# Altium footprint library Display device.PcbLib: 47 footprints (part 3 of 3)
Each footprint in its own frame and in the unit in brackets; x right, y up, seen from the top. Pads: shape width x height; smd on the part's side, far side on the other; paste and mask are expansions set on the pad; w line width, h text height; cw(c..) or ccw(c..) is an arc to the next point about the centre after c.
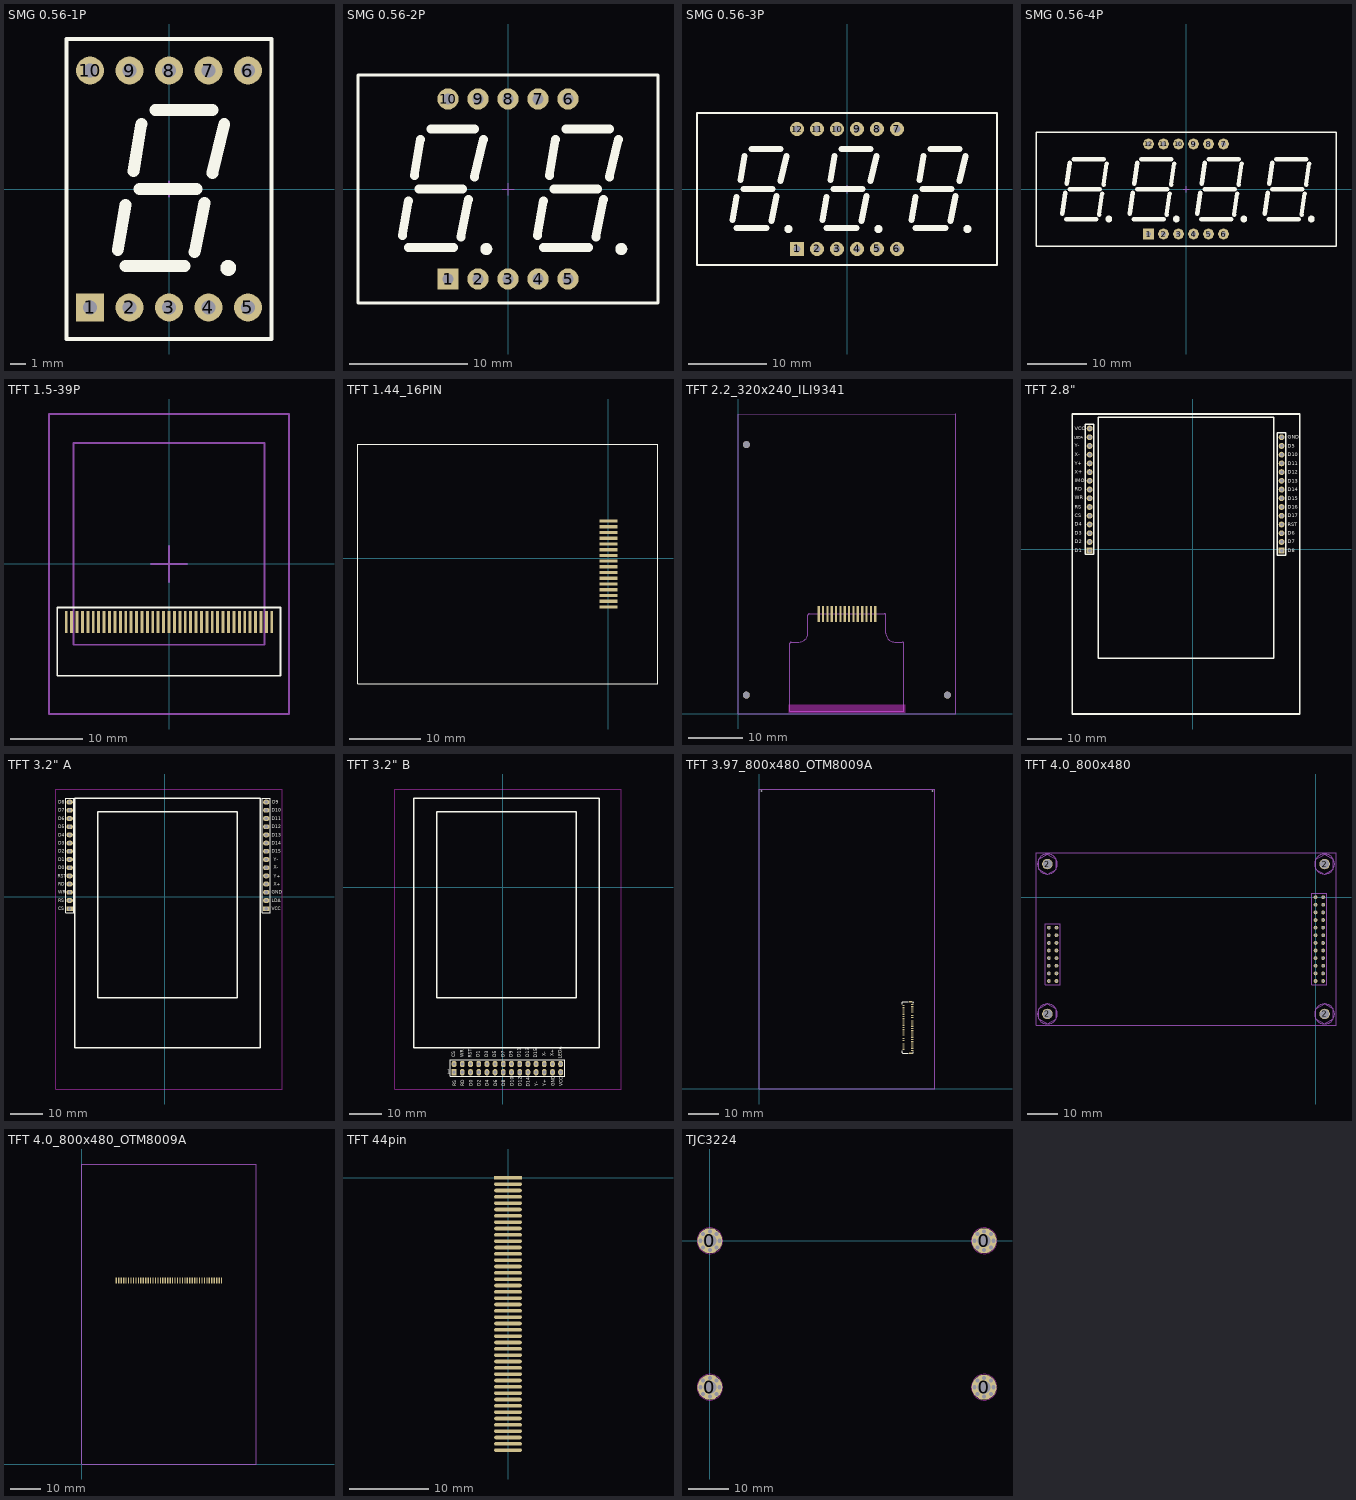
[diagram p2: the footprints below, top view; thin cyan lines are the x and y axes]

## SMG 0.56-1P [mm] "12.7*19*8mm(ï¿½ï¿½ï¿½ï¿½ï¿½)"
pads (10):
  rect 1.8x1.8 hole 0.9: 1(-5.08,-7.62)
  round 1.8 hole 0.9: 2(-2.54,-7.62) 3(0,-7.62) 4(2.54,-7.62) 5(5.08,-7.62) 6(5.08,7.62) 7(2.54,7.62) 8(0,7.62) 9(-2.54,7.62) 10(-5.08,7.62)
Top Overlay:
  circle w0.508: c3.81,-5.08 r0.254
  lines w0.254: -6.604,-9.652 -6.604,9.652 6.604,9.652 6.604,-9.652 -6.604,-9.652
  lines w0.762: -3.302,-3.937 -2.794,-1.016 ; -2.794,-4.953 1.016,-4.953 ; -2.286,1.143 -1.778,4.191 ; -1.905,0 1.778,0 ; -0.889,5.08 2.794,5.08 ; 1.651,-4.064 2.286,-0.889 ; 2.794,1.016 3.556,4.191
Mechanical 15:
  lines w0.1: -0.508,0 0.508,0 ; 0,-0.508 0,0.508
3D body "SMG 0.56-1P.STEP": height 8, standoff -3.6, extent -6.3,-9.5 6.3,9.5

## SMG 0.56-2P [mm] "25*19*8mm(ï¿½ï¿½ï¿½ï¿½ï¿½)"
pads (10):
  rect 1.8x1.8 hole 0.9: 1(-5.08,-7.62)
  round 1.8 hole 0.9: 2(-2.54,-7.62) 3(0,-7.62) 4(2.54,-7.62) 5(5.08,-7.62) 6(5.08,7.62) 7(2.54,7.62) 8(0,7.62) 9(-2.54,7.62) 10(-5.08,7.62)
Top Overlay:
  circle w0.508: c-1.841,-5.08 r0.254
  circle w0.508: c9.588,-5.08 r0.254
  lines w0.254: -12.7,-9.652 -12.7,9.652 12.7,9.652 12.7,-9.652 -12.7,-9.652
  lines w0.762: -8.954,-3.937 -8.445,-1.016 ; -8.445,-4.953 -4.635,-4.953 ; -7.938,1.143 -7.429,4.191 ; -7.556,0 -3.873,0 ; -6.54,5.08 -2.857,5.08 ; -4,-4.064 -3.365,-0.889 ; -2.857,1.016 -2.095,4.191 ; 2.476,-3.937 2.984,-1.016 ; 2.984,-4.953 6.794,-4.953 ; 3.492,1.143 4,4.191 ; 3.873,0 7.556,0 ; 4.889,5.08 8.572,5.08 ; 7.429,-4.064 8.064,-0.889 ; 8.572,1.016 9.335,4.191
Mechanical 15:
  lines w0.1: -0.508,0 0.508,0 ; 0,-0.508 0,0.508
3D body "SMG 0.56-2P.STEP": height 8, standoff -3.6, extent -12.5,-9.5 12.5,9.5

## SMG 0.56-3P [mm] "37.6*19*8mm(ï¿½ï¿½ï¿½ï¿½ï¿½)"
pads (12):
  rect 1.8x1.8 hole 0.9: 1(-6.35,-7.62)
  round 1.8 hole 0.9: 2(-3.81,-7.62) 3(-1.27,-7.62) 4(1.27,-7.62) 5(3.81,-7.62) 6(6.35,-7.62) 7(6.35,7.62) 8(3.81,7.62) 9(1.27,7.62) 10(-1.27,7.62) 11(-3.81,7.62) 12(-6.35,7.62)
Top Overlay:
  circle w0.508: c15.303,-5.08 r0.254
  circle w0.508: c-7.429,-5.08 r0.254
  circle w0.508: c4,-5.08 r0.254
  lines w0.254: -19.05,-9.652 -19.05,9.652 19.05,9.652 19.05,-9.652 -19.05,-9.652
  lines w0.762: -14.541,-3.937 -14.034,-1.016 ; -14.034,-4.953 -10.223,-4.953 ; -13.525,1.143 -13.018,4.191 ; -13.144,0 -9.461,0 ; -12.128,5.08 -8.445,5.08 ; -9.588,-4.064 -8.954,-0.889 ; -8.445,1.016 -7.683,4.191 ; -3.111,-3.937 -2.603,-1.016 ; -2.603,-4.953 1.206,-4.953 ; -2.095,1.143 -1.587,4.191 ; -1.714,0 1.968,0 ; -0.699,5.08 2.984,5.08 ; 1.841,-4.064 2.476,-0.889 ; 2.984,1.016 3.746,4.191 ; 8.191,-3.937 8.7,-1.016 ; 8.7,-4.953 12.509,-4.953 ; 9.207,1.143 9.716,4.191 ; 9.588,0 13.271,0 ; 10.604,5.08 14.287,5.08 ; 13.144,-4.064 13.779,-0.889 ; 14.287,1.016 15.05,4.191
Mechanical 15:
  lines w0.1: -0.508,0 0.508,0 ; 0,-0.508 0,0.508
3D body "SMG 0.56-3P.STEP": height 8, standoff -3.6, extent -18.8,-9.5 18.8,9.5

## SMG 0.56-4P [mm] "4Î»0.56ï¿½ï¿½ï¿½ï¿½ï¿½ï¿½Ü£ï¿½50.3*19mm"
pads (12):
  rect 1.8x1.8 hole 0.9: 1(-6.35,-7.62)
  round 1.8 hole 0.9: 2(-3.81,-7.62) 3(-1.27,-7.62) 4(1.27,-7.62) 5(3.81,-7.62) 6(6.35,-7.62) 7(6.35,7.62) 8(3.81,7.62) 9(1.27,7.62) 10(-1.27,7.62) 11(-3.81,7.62) 12(-6.35,7.62)
Top Overlay:
  circle w0.635: c-13.081,-5.08 r0.254
  circle w0.635: c-1.651,-5.08 r0.254
  circle w0.635: c9.779,-5.08 r0.254
  circle w0.635: c21.209,-5.08 r0.254
  lines w0.254: -25.4,-9.652 25.4,-9.652 25.4,9.652 -25.4,9.652 -25.4,-9.652
  lines w0.762: -20.955,-4.191 -20.447,-0.635 ; -20.32,-5.08 -15.24,-5.08 ; -20.193,0.889 -19.685,4.445 ; -19.685,0 -14.605,0 ; -19.05,5.08 -13.97,5.08 ; -14.732,-4.318 -14.224,-0.762 ; -13.97,0.762 -13.462,4.318 ; -9.525,-4.191 -9.017,-0.635 ; -8.89,-5.08 -3.81,-5.08 ; -8.763,0.889 -8.255,4.445 ; -8.255,0 -3.175,0 ; -7.62,5.08 -2.54,5.08 ; -3.302,-4.318 -2.794,-0.762 ; -2.54,0.762 -2.032,4.318 ; 1.905,-4.191 2.413,-0.635 ; 2.54,-5.08 7.62,-5.08 ; 2.667,0.889 3.175,4.445 ; 3.175,0 8.255,0 ; 3.81,5.08 8.89,5.08 ; 8.128,-4.318 8.636,-0.762 ; 8.89,0.762 9.398,4.318 ; 13.335,-4.191 13.843,-0.635 ; 13.97,-5.08 19.05,-5.08 ; 14.097,0.889 14.605,4.445 ; 14.605,0 19.685,0 ; 15.24,5.08 20.32,5.08 ; 19.558,-4.318 20.066,-0.762 ; 20.32,0.762 20.828,4.318
Mechanical 15:
  lines w0.1: -0.508,0 0.508,0 ; 0,-0.508 0,0.508
3D body "SMG 0.56-4P.STEP": height 8, standoff -3.6, extent -25.15,-9.5 25.15,9.5

## TFT 1.5-39P [mm]
pads (39):
  rect 0.4x3 smd: 1(-14.25,-8.05) 2(-13.5,-8.05) 3(-12.75,-8.05) 4(-12,-8.05) 5(-11.25,-8.05) 6(-10.5,-8.05) 7(-9.75,-8.05) 8(-9,-8.05) 9(-8.25,-8.05) 10(-7.5,-8.05) 11(-6.75,-8.05) 12(-6,-8.05) 13(-5.25,-8.05) 14(-4.5,-8.05) 15(-3.75,-8.05) 16(-3,-8.05) 17(-2.25,-8.05) 18(-1.5,-8.05) 19(-0.75,-8.05) 20(0,-8.05) 21(0.75,-8.05) 22(1.5,-8.05) 23(2.25,-8.05) 24(3,-8.05) 25(3.75,-8.05) 26(4.5,-8.05) 27(5.25,-8.05) 28(6,-8.05) 29(6.75,-8.05) 30(7.5,-8.05) 31(8.25,-8.05) 32(9,-8.05) 33(9.75,-8.05) 34(10.5,-8.05) 35(11.25,-8.05) 36(12,-8.05) 37(12.75,-8.05) 38(13.5,-8.05) 39(14.25,-8.05)
Top Overlay:
  lines w0.254: -15.495,-15.5 -15.495,-6.05 15.468,-6.05 15.468,-15.5 -15.495,-15.5
Mechanical 15:
  lines w0.254: -2.5,0 2.5,0 ; 0,-2.5 0,2.5 ; -16.65,-20.8 -16.65,20.8 16.65,20.8 16.65,-20.8 -16.65,-20.8 ; -13.25,-11.2 13.25,-11.2 13.25,16.8 -13.25,16.8 -13.25,7.7 -13.25,-11.2
3D body "TFT1.5-39P.STEP": height 6.65, standoff 0, extent -16.65,-20.884 16.65,20.85

## TFT 1.44_16PIN [mm]
pads (16):
  rect 2.5x0.45 smd: 1(0,5.2) 2(0,4.4) 3(0,3.6) 4(0,2.8) 5(0,2) 6(0,1.2) 7(0,0.4) 8(0,-0.4) 9(0,-1.2) 10(0,-2) 11(0,-2.8) 12(0,-3.6) 13(0,-4.4) 14(0,-5.2) 15(0,-6) 16(0,-6.8)
Top Overlay:
  lines w0.127: -35.015,-17.57 -35.015,15.958 6.925,15.958 6.925,-17.57 -35.015,-17.57
3D body "TFT1.44.STEP": height 2.75, standoff -0.01, extent -35.044,-17.481 6.896,15.869

## TFT 2.2_320x240_ILI9341 [mil]
pads (17):
  round 50 hole 50 unplated mask+0: 1(59.74,137) 1(60.74,1952) 1(1516.74,137)
  rect 16x118 smd mask+1: 1(993.87,724) 2(962.38,724) 3(930.88,724) 4(899.39,724) 5(867.89,724) 6(836.39,724) 7(804.9,724) 8(773.4,724) 9(741.9,724) 10(710.41,724) 11(678.91,724) 12(647.42,724) 13(615.92,724) 14(584.42,724)
Keep-Out Layer:
  board cut-out: 1212,66.34 1212,8.23 367.78,8.23 367.78,66.34
Mechanical 13:
  lines w2: 0,0 0,2174 1579,2174 1579,0 0,0 ; 376,21.34 1201,21.34 1201,511.34 ccw(c1191,511.34) 1191,521.34 1136,521.34 cw(c1136,586.34) 1071,586.34 1071,716.34 ccw(c1061,716.34) 1061,726.34 516,726.34 ccw(c516,716.34) 506,716.34 506,586.34 cw(c441,586.34) 441,521.34 386,521.34 ccw(c386,511.34) 376,511.34 376,21.34

## TFT 2.8" [mm]
pads (29):
  round 1.7 hole 1: 1(-30.067,35.178) 2(-30.067,32.638) 3(-30.067,30.098) 4(-30.067,27.558) 5(-30.067,25.018) 6(-30.067,22.478) 7(-30.067,19.938) 8(-30.067,17.398) 9(-30.067,14.858) 10(-30.067,12.318) 11(-30.067,9.778) 12(-30.067,7.238) 13(-30.067,4.698) 14(-30.067,2.158) 16(25.813,32.638) 17(25.813,30.098) 18(25.813,27.558) 19(25.813,25.018) 20(25.813,22.478) 21(25.813,19.938) 22(25.813,17.398) 23(25.813,14.858) 24(25.813,12.318) 25(25.813,9.778) 26(25.813,7.238) 27(25.813,4.698) 28(25.813,2.158)
  rect 1.7x1.7 hole 1: 15(-30.067,-0.382) 29(25.813,-0.382)
Top Overlay:
  lines w0.4: -31.337,-1.474 -28.797,-1.474 -28.797,36.448 -31.337,36.448 -31.337,0.253 -31.337,-1.474 ; -27.5,-31.73 -27.5,38.47 23.5,38.47 23.5,-31.73 -22.5,-31.73 -27.5,-31.73 ; 24.543,-1.652 27.083,-1.652 27.083,33.908 24.543,33.908 24.543,0.253 24.543,-1.652
  lines w0.508: -35.096,-47.931 -35.096,39.395 31.071,39.395 31.071,-47.931 -35.096,-47.931
  text "D8" at 27.591,-0.839 h1.02
  text "D7" at 27.591,1.726 h1.02
  text "D6" at 27.591,4.266 h1.02
  text "RST" at 27.591,6.705 h1.02
  text "D17" at 27.591,9.296 h1.02
  text "D16" at 27.591,11.81 h1.02
  text "D15" at 27.591,14.35 h1.02
  text "D14" at 27.591,16.89 h1.02
  text "D13" at 27.591,19.43 h1.02
  text "D12" at 27.591,21.97 h1.02
  text "D11" at 27.591,24.536 h1.02
  text "D10" at 27.591,27.05 h1.02
  text "GND" at 27.591,32.206 h1.02
  text "VCC" at -34.41,34.594 h1.02
  text "Y-" at -34.41,29.717 h1.02
  text "X-" at -34.41,27.05 h1.02
  text "Y+" at -34.41,24.51 h1.02
  text "X+" at -34.41,22.046 h1.02
  text "RD" at -34.41,17.043 h1.02
  text "WR" at -34.41,14.604 h1.02
  text "RS" at -34.41,11.886 h1.02
  text "CS" at -34.41,9.346 h1.02
  text "D4" at -34.41,6.883 h1.02
  text "D3" at -34.41,4.216 h1.02
  text "D2" at -34.41,1.726 h1.02
  text "D1" at -34.41,-0.814 h1.02
  text "IMO" at -34.41,19.456 h1.02
  text "D5" at 27.591,29.641 h1.02
  text "LEDA" at -34.537,32.206 h0.78

## TFT 3.2" A [mm]
pads (28):
  oval 2x1.5 hole 1: 1(-29.509,29.308) 2(-29.509,26.768) 3(-29.509,24.228) 4(-29.509,21.688) 5(-29.509,19.148) 6(-29.509,16.608) 7(-29.509,14.068) 8(-29.509,11.528) 9(-29.509,8.988) 10(-29.509,6.448) 11(-29.509,3.908) 12(-29.509,1.368) 13(-29.509,-1.172) 15(31.451,29.308) 16(31.451,26.768) 17(31.451,24.228) 18(31.451,21.688) 19(31.451,19.148) 20(31.451,16.608) 21(31.451,14.068) 22(31.451,11.528) 23(31.451,8.988) 24(31.451,6.448) 25(31.451,3.908) 26(31.451,1.368) 27(31.451,-1.172)
  rect 2x1.5 hole 1: 14(-29.509,-3.712) 28(31.451,-3.712)
Top Overlay:
  lines w0.2: -30.779,-4.982 -30.779,-3.077 -30.779,30.578 -28.239,30.578 -28.239,-4.982 -30.779,-4.982 ; 30.181,-4.982 30.181,-3.077 30.181,30.578 32.721,30.578 32.721,-4.982 30.181,-4.982
  lines w0.4: -27.856,-46.78 -27.856,30.441 29.544,30.441 29.544,-46.78 -27.856,-46.78 ; -20.756,-31.259 -20.756,26.341 22.444,26.341 22.444,-31.259 -20.756,-31.259
  text "D8" at -33.065,28.8 h1.02
  text "D7" at -33.065,26.26 h1.02
  text "D6" at -33.065,23.72 h1.02
  text "D5" at -33.065,21.18 h1.02
  text "D4" at -33.065,18.64 h1.02
  text "D3" at -33.065,16.1 h1.02
  text "D2" at -33.065,13.56 h1.02
  text "D1" at -33.065,11.02 h1.02
  text "D0" at -33.065,8.48 h1.02
  text "RST" at -33.192,5.94 h1.02
  text "RD" at -33.065,3.4 h1.02
  text "WR" at -33.065,0.86 h1.02
  text "RS" at -33.065,-1.68 h1.02
  text "CS" at -33.065,-4.22 h1.02
  text "VCC" at 33.102,-4.22 h1.02
  text "LDA" at 33.102,-1.68 h1.02
  text "GND" at 33.102,0.86 h1.02
  text "X+" at 33.737,3.4 h1.02
  text "Y+" at 33.737,5.94 h1.02
  text "X-" at 33.737,8.607 h1.02
  text "Y-" at 33.737,11.02 h1.02
  text "D15" at 33.102,13.56 h1.02
  text "D14" at 33.102,16.1 h1.02
  text "D13" at 33.102,18.64 h1.02
  text "D12" at 33.102,21.18 h1.02
  text "D11" at 33.102,23.72 h1.02
  text "D10" at 33.102,26.26 h1.02
  text "D9" at 33.229,28.8 h1.02
Keep-Out Layer:
  lines w0.254: -33.827,-59.592 -33.827,33.372 36.404,33.372 36.404,-59.592 -33.827,-59.592

## TFT 3.2" B [mm]
pads (28):
  oval 1.5x2 hole 1: 1(0.091,-57.283) 2(0.091,-54.743) 3(-2.449,-57.283) 4(-2.449,-54.743) 5(-4.989,-57.283) 6(-4.989,-54.743) 7(-7.529,-57.283) 8(-7.529,-54.743) 9(-10.069,-57.283) 10(-10.069,-54.743) 11(-12.609,-57.283) 12(-12.609,-54.743) 14(-15.149,-54.743) 15(2.631,-54.743) 16(2.631,-57.283) 17(5.171,-54.743) 18(5.171,-57.283) 19(7.711,-54.743) 20(7.711,-57.283) 21(10.251,-54.743) 22(10.251,-57.283) 23(12.791,-54.743) 24(12.791,-57.283) 25(15.331,-54.743) 26(15.331,-57.283) 27(17.871,-54.743) 28(17.871,-57.283)
  rect 1.5x2 hole 1: 13(-15.149,-57.283)
Top Overlay:
  lines w0.2: -16.419,-58.553 19.141,-58.553 19.141,-53.473 -16.419,-53.473 -16.419,-58.553
  lines w0.4: -27.593,-49.678 -27.593,27.543 29.807,27.543 29.807,-49.678 -27.593,-49.678 ; -20.493,-34.157 -20.493,23.443 22.707,23.443 22.707,-34.157 -20.493,-34.157
  text "VCC" at 18.506,-61.601 h1.02
  text "GND" at 15.966,-61.601 h1.02
  text "Y+" at 13.426,-61.601 h1.02
  text "Y-" at 10.886,-61.601 h1.02
  text "D14" at 8.346,-61.728 h1.02
  text "D12" at 5.806,-61.601 h1.02
  text "D10" at 3.266,-61.601 h1.02
  text "D8" at 0.726,-61.601 h1.02
  text "D6" at -1.814,-61.601 h1.02
  text "D4" at -4.354,-61.601 h1.02
  text "D2" at -6.894,-61.601 h1.02
  text "D0" at -9.434,-61.601 h1.02
  text "RD" at -11.974,-61.601 h1.02
  text "RS" at -14.514,-61.601 h1.02
  text "LEDA" at 18.252,-53.092 h1.02
  text "X+" at 15.712,-52.33 h1.02
  text "X-" at 13.172,-52.33 h1.02
  text "D15" at 10.632,-52.838 h1.02
  text "D13" at 8.092,-52.711 h1.02
  text "D11" at 5.552,-52.711 h1.02
  text "D9" at 3.012,-52.584 h1.02
  text "D7" at 0.472,-52.584 h1.02
  text "D5" at -2.068,-52.584 h1.02
  text "D3" at -4.608,-52.584 h1.02
  text "D1" at -7.148,-52.584 h1.02
  text "RST" at -9.688,-52.838 h1.02
  text "WR" at -12.228,-52.584 h1.02
  text "CS" at -14.768,-52.584 h1.02
  text "1" at -17.308,-57.791 h1.27
Keep-Out Layer:
  lines w0.254: -33.564,-62.49 -33.564,30.474 36.667,30.474 36.667,-62.49 -33.564,-62.49

## TFT 3.97_800x480_OTM8009A [mil]
pads (55):
  round 0 hole 25 mask+0: 0(31.5,3827.38) 0(2226.5,3827.38)
  rect 40x16 smd: 0(1947,459.27) 0(1947,1118.72)
  rect 30x12 smd: 1(1967,1084.28) 2(1855,1072.46) 3(1967,1060.65) 4(1855,1048.84) 5(1967,1037.03) 6(1855,1025.22) 7(1967,1013.41) 8(1855,1001.6) 9(1967,989.79) 10(1855,977.98) 11(1967,966.16) 12(1855,954.35) 13(1967,942.54) 14(1855,930.73) 15(1967.19,918.92) 16(1855,907.11) 17(1967,895.3) 18(1855,883.49) 19(1967,871.68) 20(1855,859.87) 21(1967,848.05) 22(1855,836.24) 23(1967,824.43) 24(1855,812.62) 25(1967,800.81) 26(1855,789) 27(1967,777.19) 28(1855,765.38) 29(1967,753.57) 30(1855,741.76) 31(1967,729.95) 32(1855,718.13) 33(1967,706.32) 34(1855,694.51) 35(1967,682.7) 36(1855,670.89) 37(1967,659.08) 38(1855,647.27) 39(1967,635.46) 40(1855,623.65) 41(1967,611.84) 42(1855,600.02) 43(1967,588.21) 44(1855,576.4) 45(1967,564.59) 46(1855,552.78) 47(1967,540.97) 48(1855,529.16) 49(1967,517.35) 50(1855,505.54) 51(1967,493.73)
Top Overlay:
  lines w6: 1841,491 1841,464 1846,459 ; 1841,1087 1841,1114 1846,1119 ; 1846.28,459 1918,459 ; 1846.28,1119 1918,1119 ; 1976,459 1981,464 1981,479 ; 1976,1119 1981,1114 1981,1099
Mechanical 13:
  lines w2: 0,0 2258,0 2258,3851 0,3851 0,0
Mechanical 14:
  lines w2: 0,0 2258,0 2258,3851 0,3851 0,0
3D body "10061122511420hlf.stp": height 35.43, standoff 0, extent 1842.15,452.4 1979.55,1125.62

## TFT 4.0_800x480 [mil]
pads (44):
  round 50 hole 31: 1(0,0) 2(100,0) 3(0,-100) 4(100,-100) 5(0,-200) 6(100,-200) 7(0,-300) 8(100,-300) 9(0,-400) 10(100,-400) 11(0,-500) 12(100,-500) 13(0,-600) 14(100,-600) 15(0,-700) 16(100,-700) 17(0,-800) 18(100,-800) 19(0,-900) 20(100,-900) 21(0,-1000) 22(100,-1000) 23(0,-1100) 24(100,-1100) 25(-3500,-400) 26(-3400,-400) 27(-3500,-500) 28(-3400,-500) 29(-3500,-600) 30(-3400,-600) 31(-3500,-700) 32(-3400,-700) 33(-3500,-800) 34(-3400,-800) 35(-3500,-900) 36(-3400,-900) 37(-3500,-1000) 38(-3400,-1000) 39(-3500,-1100) 40(-3400,-1100)
  round 137.8 hole 118.11 mask+0: 2(-3518.5,-1532.5) 2(-3518.5,435) 2(118.5,-1532.5) 2(118.5,435)
Mechanical 13:
  circle w2: c118.5,435 r130.98
  circle w2: c-3518.5,435 r130.98
  circle w2: c-3518.5,-1532.5 r130.98
  circle w2: c118.5,-1532.5 r130.98
  lines w2: -3668.5,-1682.5 -3668.5,585 268.5,585 268.5,-1682.5 -3668.5,-1682.5 ; -3631.93,-1597.99 -3631.93,-1467.01 -3518.5,-1401.52 -3405.08,-1467.01 -3405.08,-1597.99 -3518.5,-1663.48 -3631.93,-1597.99 ; -3631.93,369.51 -3631.93,500.49 -3518.5,565.98 -3405.08,500.49 -3405.08,369.51 -3518.5,304.02 -3631.93,369.51 ; -3550,-1150 -3350,-1150 -3350,-350 -3550,-350 -3550,-1150 ; -50,-1150 150,-1150 150,50 -50,50 -50,-1150 ; 5.07,-1597.99 118.5,-1663.48 231.93,-1597.99 231.93,-1467.01 118.5,-1401.52 5.07,-1467.01 5.07,-1597.99 ; 5.07,369.51 5.07,500.49 118.5,565.98 231.93,500.49 231.93,369.51 118.5,304.02 5.07,369.51
Mechanical 15:
  lines w1: -3510,-400 -3490,-400 ; -3500,-410 -3500,-390 ; -10,0 10,0 ; 0,-10 0,10

## TFT 4.0_800x480_OTM8009A [mm]
pads (44):
  rect 0.4x2 smd: 1(11.3,60) 2(12.1,60) 3(12.9,60) 4(13.7,60) 5(14.5,60) 6(15.3,60) 7(16.1,60) 8(16.9,60) 9(17.7,60) 10(18.5,60) 11(19.3,60) 12(20.1,60) 13(20.9,60) 14(21.7,60) 15(22.5,60) 16(23.3,60) 17(24.1,60) 18(24.9,60) 19(25.7,60) 20(26.5,60) 21(27.3,60) 22(28.1,60) 23(28.9,60) 24(29.7,60) 25(30.5,60) 26(31.3,60) 27(32.1,60) 28(32.9,60) 29(33.7,60) 30(34.5,60) 31(35.3,60) 32(36.1,60) 33(36.9,60) 34(37.7,60) 35(38.5,60) 36(39.3,60) 37(40.1,60) 38(40.9,60) 39(41.7,60) 40(42.5,60) 41(43.3,60) 42(44.1,60) 43(44.9,60) 44(45.7,60)
Mechanical 13:
  lines w0.051: 0,0 57.023,0 57.023,98.044 0,98.044 0,0

## TFT 44pin [mm]
pads (44):
  rect 3.5x0.45 smd: 1(0,0)
  oval 3.5x0.45 smd: 2(0,-0.8) 3(0,-1.6) 4(0,-2.4) 5(0,-3.2) 6(0,-4) 7(0,-4.8) 8(0,-5.6) 9(0,-6.4) 10(0,-7.2) 11(0,-8) 12(0,-8.8) 13(0,-9.6) 14(0,-10.4) 15(0,-11.2) 16(0,-12) 17(0,-12.8) 18(0,-13.6) 19(0,-14.4) 20(0,-15.2) 21(0,-16) 22(0,-16.8) 23(0,-17.6) 24(0,-18.4) 25(0,-19.2) 26(0,-20) 27(0,-20.8) 28(0,-21.6) 29(0,-22.4) 30(0,-23.2) 31(0,-24) 32(0,-24.8) 33(0,-25.6) 34(0,-26.4) 35(0,-27.2) 36(0,-28) 37(0,-28.8) 38(0,-29.6) 39(0,-30.4) 40(0,-31.2) 41(0,-32) 42(0,-32.8) 43(0,-33.6) 44(0,-34.4)

## TJC3224 [mm]
pads (36):
  round 1 hole 1: 0(-2.35,-36.49) 0(-2.35,0) 0(-1.662,-38.152) 0(-1.662,-34.828) 0(-1.662,-1.662) 0(-1.662,1.662) 0(0,-38.84) 0(0,-34.14) 0(0,-2.35) 0(0,2.35) 0(1.662,-38.152) 0(1.662,-34.828) 0(1.662,-1.662) 0(1.662,1.662) 0(2.35,-36.49) 0(2.35,0) 0(65.97,-36.49) 0(65.97,0) 0(66.658,-38.152) 0(66.658,-34.828) 0(66.658,-1.662) 0(66.658,1.662) 0(68.32,-38.84) 0(68.32,-34.14) 0(68.32,-2.35) 0(68.32,2.35) 0(69.982,-38.152) 0(69.982,-34.828) 0(69.982,-1.662) 0(69.982,1.662) 0(70.67,-36.49) 0(70.67,0)
  round 6.2 hole 3.2: 0(0,-36.49) 0(0,0) 0(68.32,-36.49) 0(68.32,0)
Keep-Out Layer:
  circle w0.254: c0,0 r3.2
  circle w0.254: c68.32,0 r3.2
  circle w0.254: c68.32,-36.49 r3.2
  circle w0.254: c0,-36.49 r3.2
3D body "TJC3224.stp": height 15.8, standoff 0, extent -3.023,-39.573 71.377,3.147